# Altium footprint library smd-ipc.PCBLIB: 363 footprints (part 20 of 27)
Each footprint in its own frame and in the unit in brackets; x right, y up, seen from the top. Pads: shape width x height; smd on the part's side, far side on the other; paste and mask are expansions set on the pad; w line width, h text height; cw(c..) or ccw(c..) is an arc to the next point about the centre after c.
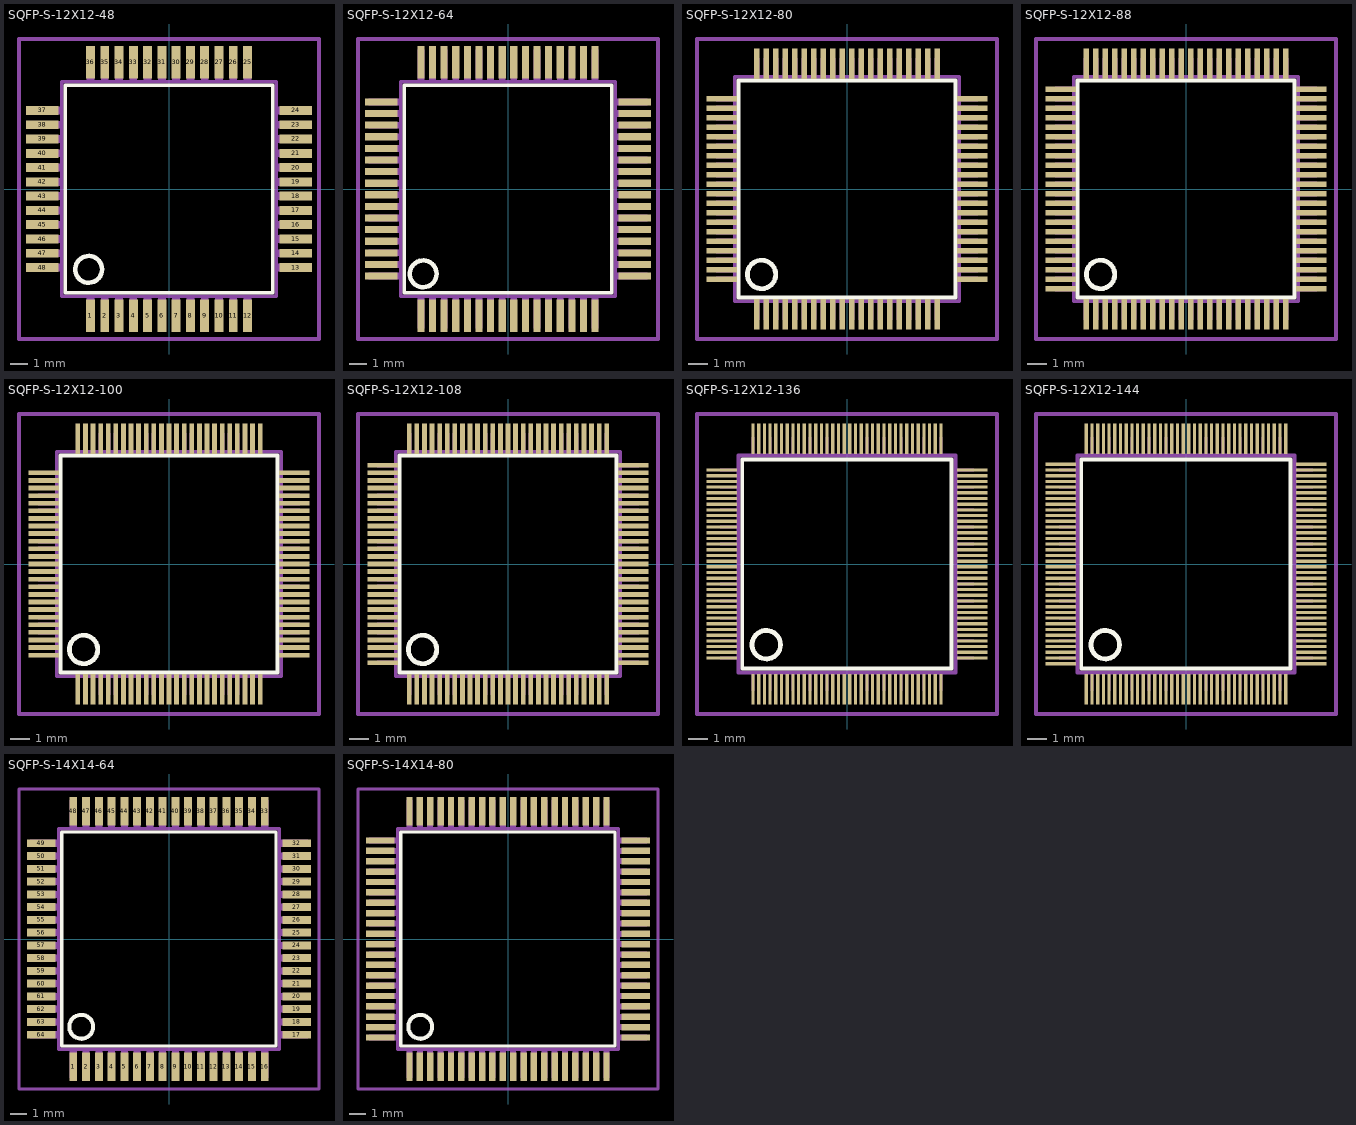
[diagram p19: the footprints below, top view; thin cyan lines are the x and y axes]

## SQFP-S-12X12-48 [mm]
pads (48):
  rect 0.5x1.8 smd: 1(-4.4,-7.1) 2(-3.6,-7.1) 3(-2.8,-7.1) 4(-2,-7.1) 5(-1.2,-7.1) 6(-0.4,-7.1) 7(0.4,-7.1) 8(1.2,-7.1) 9(2,-7.1) 10(2.8,-7.1) 11(3.6,-7.1) 12(4.4,-7.1) 25(4.4,7.1) 26(3.6,7.1) 27(2.8,7.1) 28(2,7.1) 29(1.2,7.1) 30(0.4,7.1) 31(-0.4,7.1) 32(-1.2,7.1) 33(-2,7.1) 34(-2.8,7.1) 35(-3.6,7.1) 36(-4.4,7.1)
  rect 1.8x0.5 smd: 13(7.1,-4.4) 14(7.1,-3.6) 15(7.1,-2.8) 16(7.1,-2) 17(7.1,-1.2) 18(7.1,-0.4) 19(7.1,0.4) 20(7.1,1.2) 21(7.1,2) 22(7.1,2.8) 23(7.1,3.6) 24(7.1,4.4) 37(-7.1,4.4) 38(-7.1,3.6) 39(-7.1,2.8) 40(-7.1,2) 41(-7.1,1.2) 42(-7.1,0.4) 43(-7.1,-0.4) 44(-7.1,-1.2) 45(-7.1,-2) 46(-7.1,-2.8) 47(-7.1,-3.6) 48(-7.1,-4.4)
Top Overlay:
  circle w0.254: c-4.5,-4.5 r0.75
  lines w0.203: -5.82,-5.81 5.81,-5.81 5.81,5.81 -5.82,5.81 -5.82,-5.81
Mechanical 16:
  rectangle: -4.62,-7.82 -4.18,-6.05
  rectangle: -3.82,-7.82 -3.38,-6.05
  rectangle: -3.02,-7.82 -2.58,-6.05
  rectangle: -2.22,-7.82 -1.78,-6.05
  rectangle: -1.42,-7.82 -0.98,-6.05
  rectangle: -0.62,-7.82 -0.18,-6.05
  rectangle: 0.18,-7.82 0.62,-6.05
  rectangle: 0.98,-7.82 1.42,-6.05
  rectangle: 1.78,-7.82 2.22,-6.05
  rectangle: 2.58,-7.82 3.02,-6.05
  rectangle: 3.38,-7.82 3.82,-6.05
  rectangle: 4.18,-7.82 4.62,-6.05
  rectangle: 6.05,-4.62 7.82,-4.18
  rectangle: 6.05,-3.82 7.82,-3.38
  rectangle: 6.05,-3.02 7.82,-2.58
  rectangle: 6.05,-2.22 7.82,-1.78
  rectangle: 6.05,-1.42 7.82,-0.98
  rectangle: 6.05,-0.62 7.82,-0.18
  rectangle: 6.05,0.18 7.82,0.62
  rectangle: 6.05,0.98 7.82,1.42
  rectangle: 6.05,1.78 7.82,2.22
  rectangle: 6.05,2.58 7.82,3.02
  rectangle: 6.05,3.38 7.82,3.82
  rectangle: 6.05,4.18 7.82,4.62
  rectangle: 4.18,6.05 4.62,7.82
  rectangle: 3.38,6.05 3.82,7.82
  rectangle: 2.58,6.05 3.02,7.82
  rectangle: 1.78,6.05 2.22,7.82
  rectangle: 0.98,6.05 1.42,7.82
  rectangle: 0.18,6.05 0.62,7.82
  rectangle: -0.62,6.05 -0.18,7.82
  rectangle: -1.42,6.05 -0.98,7.82
  rectangle: -2.22,6.05 -1.78,7.82
  rectangle: -3.02,6.05 -2.58,7.82
  rectangle: -3.82,6.05 -3.38,7.82
  rectangle: -4.62,6.05 -4.18,7.82
  rectangle: -7.82,4.18 -6.05,4.62
  rectangle: -7.82,3.38 -6.05,3.82
  rectangle: -7.82,2.58 -6.05,3.02
  rectangle: -7.82,1.78 -6.05,2.22
  rectangle: -7.82,0.98 -6.05,1.42
  rectangle: -7.82,0.18 -6.05,0.62
  rectangle: -7.82,-0.62 -6.05,-0.18
  rectangle: -7.82,-1.42 -6.05,-0.98
  rectangle: -7.82,-2.22 -6.05,-1.78
  rectangle: -7.82,-3.02 -6.05,-2.58
  rectangle: -7.82,-3.82 -6.05,-3.38
  rectangle: -7.82,-4.62 -6.05,-4.18
  lines w0.203: -6.01,-6.01 6.01,-6.01 6.01,6.01 -6.01,6.01 -6.01,-6.01
Mechanical 27:
  lines w0.2: -8.4,-8.4 -8.4,8.4 8.4,8.4 8.4,-8.4 -8.4,-8.4

## SQFP-S-12X12-64 [mm]
pads (64):
  rect 0.4x1.8 smd: 1(-4.875,-7.1) 2(-4.225,-7.1) 3(-3.575,-7.1) 4(-2.925,-7.1) 5(-2.275,-7.1) 6(-1.625,-7.1) 7(-0.975,-7.1) 8(-0.325,-7.1) 9(0.325,-7.1) 10(0.975,-7.1) 11(1.625,-7.1) 12(2.275,-7.1) 13(2.925,-7.1) 14(3.575,-7.1) 15(4.225,-7.1) 16(4.875,-7.1) 33(4.875,7.1) 34(4.225,7.1) 35(3.575,7.1) 36(2.925,7.1) 37(2.275,7.1) 38(1.625,7.1) 39(0.975,7.1) 40(0.325,7.1) 41(-0.325,7.1) 42(-0.975,7.1) 43(-1.625,7.1) 44(-2.275,7.1) 45(-2.925,7.1) 46(-3.575,7.1) 47(-4.225,7.1) 48(-4.875,7.1)
  rect 1.8x0.4 smd: 17(7.1,-4.875) 18(7.1,-4.225) 19(7.1,-3.575) 20(7.1,-2.925) 21(7.1,-2.275) 22(7.1,-1.625) 23(7.1,-0.975) 24(7.1,-0.325) 25(7.1,0.325) 26(7.1,0.975) 27(7.1,1.625) 28(7.1,2.275) 29(7.1,2.925) 30(7.1,3.575) 31(7.1,4.225) 32(7.1,4.875) 49(-7.1,4.875) 50(-7.1,4.225) 51(-7.1,3.575) 52(-7.1,2.925) 53(-7.1,2.275) 54(-7.1,1.625) 55(-7.1,0.975) 56(-7.1,0.325) 57(-7.1,-0.325) 58(-7.1,-0.975) 59(-7.1,-1.625) 60(-7.1,-2.275) 61(-7.1,-2.925) 62(-7.1,-3.575) 63(-7.1,-4.225) 64(-7.1,-4.875)
Top Overlay:
  circle w0.254: c-4.75,-4.75 r0.75
  lines w0.203: -5.82,-5.81 5.81,-5.81 5.81,5.81 -5.82,5.81 -5.82,-5.81
Mechanical 16:
  rectangle: -5.065,-7.82 -4.685,-6.05
  rectangle: -4.415,-7.82 -4.035,-6.05
  rectangle: -3.765,-7.82 -3.385,-6.05
  rectangle: -3.115,-7.82 -2.735,-6.05
  rectangle: -2.465,-7.82 -2.085,-6.05
  rectangle: -1.815,-7.82 -1.435,-6.05
  rectangle: -1.165,-7.82 -0.785,-6.05
  rectangle: -0.515,-7.82 -0.135,-6.05
  rectangle: 0.135,-7.82 0.515,-6.05
  rectangle: 0.785,-7.82 1.165,-6.05
  rectangle: 1.435,-7.82 1.815,-6.05
  rectangle: 2.085,-7.82 2.465,-6.05
  rectangle: 2.735,-7.82 3.115,-6.05
  rectangle: 3.385,-7.82 3.765,-6.05
  rectangle: 4.035,-7.82 4.415,-6.05
  rectangle: 4.685,-7.82 5.065,-6.05
  rectangle: 6.05,-5.065 7.82,-4.685
  rectangle: 6.05,-4.415 7.82,-4.035
  rectangle: 6.05,-3.765 7.82,-3.385
  rectangle: 6.05,-3.115 7.82,-2.735
  rectangle: 6.05,-2.465 7.82,-2.085
  rectangle: 6.05,-1.815 7.82,-1.435
  rectangle: 6.05,-1.165 7.82,-0.785
  rectangle: 6.05,-0.515 7.82,-0.135
  rectangle: 6.05,0.135 7.82,0.515
  rectangle: 6.05,0.785 7.82,1.165
  rectangle: 6.05,1.435 7.82,1.815
  rectangle: 6.05,2.085 7.82,2.465
  rectangle: 6.05,2.735 7.82,3.115
  rectangle: 6.05,3.385 7.82,3.765
  rectangle: 6.05,4.035 7.82,4.415
  rectangle: 6.05,4.685 7.82,5.065
  rectangle: 4.685,6.05 5.065,7.82
  rectangle: 4.035,6.05 4.415,7.82
  rectangle: 3.385,6.05 3.765,7.82
  rectangle: 2.735,6.05 3.115,7.82
  rectangle: 2.085,6.05 2.465,7.82
  rectangle: 1.435,6.05 1.815,7.82
  rectangle: 0.785,6.05 1.165,7.82
  rectangle: 0.135,6.05 0.515,7.82
  rectangle: -0.515,6.05 -0.135,7.82
  rectangle: -1.165,6.05 -0.785,7.82
  rectangle: -1.815,6.05 -1.435,7.82
  rectangle: -2.465,6.05 -2.085,7.82
  rectangle: -3.115,6.05 -2.735,7.82
  rectangle: -3.765,6.05 -3.385,7.82
  rectangle: -4.415,6.05 -4.035,7.82
  rectangle: -5.065,6.05 -4.685,7.82
  rectangle: -7.82,4.685 -6.05,5.065
  rectangle: -7.82,4.035 -6.05,4.415
  rectangle: -7.82,3.385 -6.05,3.765
  rectangle: -7.82,2.735 -6.05,3.115
  rectangle: -7.82,2.085 -6.05,2.465
  rectangle: -7.82,1.435 -6.05,1.815
  rectangle: -7.82,0.785 -6.05,1.165
  rectangle: -7.82,0.135 -6.05,0.515
  rectangle: -7.82,-0.515 -6.05,-0.135
  rectangle: -7.82,-1.165 -6.05,-0.785
  rectangle: -7.82,-1.815 -6.05,-1.435
  rectangle: -7.82,-2.465 -6.05,-2.085
  rectangle: -7.82,-3.115 -6.05,-2.735
  rectangle: -7.82,-3.765 -6.05,-3.385
  rectangle: -7.82,-4.415 -6.05,-4.035
  rectangle: -7.82,-5.065 -6.05,-4.685
  lines w0.203: -6.01,-6.01 6.01,-6.01 6.01,6.01 -6.01,6.01 -6.01,-6.01
Mechanical 27:
  lines w0.2: -8.4,-8.4 -8.4,8.4 8.4,8.4 8.4,-8.4 -8.4,-8.4

## SQFP-S-12X12-80 [mm]
pads (80):
  rect 0.3x1.6 smd: 1(-4.75,-6.6) 2(-4.25,-6.6) 3(-3.75,-6.6) 4(-3.25,-6.6) 5(-2.75,-6.6) 6(-2.25,-6.6) 7(-1.75,-6.6) 8(-1.25,-6.6) 9(-0.75,-6.6) 10(-0.25,-6.6) 11(0.25,-6.6) 12(0.75,-6.6) 13(1.25,-6.6) 14(1.75,-6.6) 15(2.25,-6.6) 16(2.75,-6.6) 17(3.25,-6.6) 18(3.75,-6.6) 19(4.25,-6.6) 20(4.75,-6.6) 41(4.75,6.6) 42(4.25,6.6) 43(3.75,6.6) 44(3.25,6.6) 45(2.75,6.6) 46(2.25,6.6) 47(1.75,6.6) 48(1.25,6.6) 49(0.75,6.6) 50(0.25,6.6) 51(-0.25,6.6) 52(-0.75,6.6) 53(-1.25,6.6) 54(-1.75,6.6) 55(-2.25,6.6) 56(-2.75,6.6) 57(-3.25,6.6) 58(-3.75,6.6) 59(-4.25,6.6) 60(-4.75,6.6)
  rect 1.6x0.3 smd: 21(6.6,-4.75) 22(6.6,-4.25) 23(6.6,-3.75) 24(6.6,-3.25) 25(6.6,-2.75) 26(6.6,-2.25) 27(6.6,-1.75) 28(6.6,-1.25) 29(6.6,-0.75) 30(6.6,-0.25) 31(6.6,0.25) 32(6.6,0.75) 33(6.6,1.25) 34(6.6,1.75) 35(6.6,2.25) 36(6.6,2.75) 37(6.6,3.25) 38(6.6,3.75) 39(6.6,4.25) 40(6.6,4.75) 61(-6.6,4.75) 62(-6.6,4.25) 63(-6.6,3.75) 64(-6.6,3.25) 65(-6.6,2.75) 66(-6.6,2.25) 67(-6.6,1.75) 68(-6.6,1.25) 69(-6.6,0.75) 70(-6.6,0.25) 71(-6.6,-0.25) 72(-6.6,-0.75) 73(-6.6,-1.25) 74(-6.6,-1.75) 75(-6.6,-2.25) 76(-6.6,-2.75) 77(-6.6,-3.25) 78(-6.6,-3.75) 79(-6.6,-4.25) 80(-6.6,-4.75)
Top Overlay:
  circle w0.254: c-4.5,-4.5 r0.75
  lines w0.203: -5.72,-5.71 5.71,-5.71 5.71,5.71 -5.72,5.71 -5.72,-5.71
Mechanical 16:
  rectangle: -4.9,-6.9 -4.6,-5.95
  rectangle: -4.4,-6.9 -4.1,-5.95
  rectangle: -3.9,-6.9 -3.6,-5.95
  rectangle: -3.4,-6.9 -3.1,-5.95
  rectangle: -2.9,-6.9 -2.6,-5.95
  rectangle: -2.4,-6.9 -2.1,-5.95
  rectangle: -1.9,-6.9 -1.6,-5.95
  rectangle: -1.4,-6.9 -1.1,-5.95
  rectangle: -0.9,-6.9 -0.6,-5.95
  rectangle: -0.4,-6.9 -0.1,-5.95
  rectangle: 0.1,-6.9 0.4,-5.95
  rectangle: 0.6,-6.9 0.9,-5.95
  rectangle: 1.1,-6.9 1.4,-5.95
  rectangle: 1.6,-6.9 1.9,-5.95
  rectangle: 2.1,-6.9 2.4,-5.95
  rectangle: 2.6,-6.9 2.9,-5.95
  rectangle: 3.1,-6.9 3.4,-5.95
  rectangle: 3.6,-6.9 3.9,-5.95
  rectangle: 4.1,-6.9 4.4,-5.95
  rectangle: 4.6,-6.9 4.9,-5.95
  rectangle: 5.95,-4.9 6.9,-4.6
  rectangle: 5.95,-4.4 6.9,-4.1
  rectangle: 5.95,-3.9 6.9,-3.6
  rectangle: 5.95,-3.4 6.9,-3.1
  rectangle: 5.95,-2.9 6.9,-2.6
  rectangle: 5.95,-2.4 6.9,-2.1
  rectangle: 5.95,-1.9 6.9,-1.6
  rectangle: 5.95,-1.4 6.9,-1.1
  rectangle: 5.95,-0.9 6.9,-0.6
  rectangle: 5.95,-0.4 6.9,-0.1
  rectangle: 5.95,0.1 6.9,0.4
  rectangle: 5.95,0.6 6.9,0.9
  rectangle: 5.95,1.1 6.9,1.4
  rectangle: 5.95,1.6 6.9,1.9
  rectangle: 5.95,2.1 6.9,2.4
  rectangle: 5.95,2.6 6.9,2.9
  rectangle: 5.95,3.1 6.9,3.4
  rectangle: 5.95,3.6 6.9,3.9
  rectangle: 5.95,4.1 6.9,4.4
  rectangle: 5.95,4.6 6.9,4.9
  rectangle: 4.6,5.95 4.9,6.9
  rectangle: 4.1,5.95 4.4,6.9
  rectangle: 3.6,5.95 3.9,6.9
  rectangle: 3.1,5.95 3.4,6.9
  rectangle: 2.6,5.95 2.9,6.9
  rectangle: 2.1,5.95 2.4,6.9
  rectangle: 1.6,5.95 1.9,6.9
  rectangle: 1.1,5.95 1.4,6.9
  rectangle: 0.6,5.95 0.9,6.9
  rectangle: 0.1,5.95 0.4,6.9
  rectangle: -0.4,5.95 -0.1,6.9
  rectangle: -0.9,5.95 -0.6,6.9
  rectangle: -1.4,5.95 -1.1,6.9
  rectangle: -1.9,5.95 -1.6,6.9
  rectangle: -2.4,5.95 -2.1,6.9
  rectangle: -2.9,5.95 -2.6,6.9
  rectangle: -3.4,5.95 -3.1,6.9
  rectangle: -3.9,5.95 -3.6,6.9
  rectangle: -4.4,5.95 -4.1,6.9
  rectangle: -4.9,5.95 -4.6,6.9
  rectangle: -6.9,4.6 -5.95,4.9
  rectangle: -6.9,4.1 -5.95,4.4
  rectangle: -6.9,3.6 -5.95,3.9
  rectangle: -6.9,3.1 -5.95,3.4
  rectangle: -6.9,2.6 -5.95,2.9
  rectangle: -6.9,2.1 -5.95,2.4
  rectangle: -6.9,1.6 -5.95,1.9
  rectangle: -6.9,1.1 -5.95,1.4
  rectangle: -6.9,0.6 -5.95,0.9
  rectangle: -6.9,0.1 -5.95,0.4
  rectangle: -6.9,-0.4 -5.95,-0.1
  rectangle: -6.9,-0.9 -5.95,-0.6
  rectangle: -6.9,-1.4 -5.95,-1.1
  rectangle: -6.9,-1.9 -5.95,-1.6
  rectangle: -6.9,-2.4 -5.95,-2.1
  rectangle: -6.9,-2.9 -5.95,-2.6
  rectangle: -6.9,-3.4 -5.95,-3.1
  rectangle: -6.9,-3.9 -5.95,-3.6
  rectangle: -6.9,-4.4 -5.95,-4.1
  rectangle: -6.9,-4.9 -5.95,-4.6
  lines w0.203: -5.91,-5.91 5.91,-5.91 5.91,5.91 -5.91,5.91 -5.91,-5.91
Mechanical 27:
  lines w0.2: -7.9,-7.9 -7.9,7.9 7.9,7.9 7.9,-7.9 -7.9,-7.9

## SQFP-S-12X12-88 [mm]
pads (88):
  rect 0.3x1.6 smd: 1(-5.25,-6.6) 2(-4.75,-6.6) 3(-4.25,-6.6) 4(-3.75,-6.6) 5(-3.25,-6.6) 6(-2.75,-6.6) 7(-2.25,-6.6) 8(-1.75,-6.6) 9(-1.25,-6.6) 10(-0.75,-6.6) 11(-0.25,-6.6) 12(0.25,-6.6) 13(0.75,-6.6) 14(1.25,-6.6) 15(1.75,-6.6) 16(2.25,-6.6) 17(2.75,-6.6) 18(3.25,-6.6) 19(3.75,-6.6) 20(4.25,-6.6) 21(4.75,-6.6) 22(5.25,-6.6) 45(5.25,6.6) 46(4.75,6.6) 47(4.25,6.6) 48(3.75,6.6) 49(3.25,6.6) 50(2.75,6.6) 51(2.25,6.6) 52(1.75,6.6) 53(1.25,6.6) 54(0.75,6.6) 55(0.25,6.6) 56(-0.25,6.6) 57(-0.75,6.6) 58(-1.25,6.6) 59(-1.75,6.6) 60(-2.25,6.6) 61(-2.75,6.6) 62(-3.25,6.6) 63(-3.75,6.6) 64(-4.25,6.6) 65(-4.75,6.6) 66(-5.25,6.6)
  rect 1.6x0.3 smd: 23(6.6,-5.25) 24(6.6,-4.75) 25(6.6,-4.25) 26(6.6,-3.75) 27(6.6,-3.25) 28(6.6,-2.75) 29(6.6,-2.25) 30(6.6,-1.75) 31(6.6,-1.25) 32(6.6,-0.75) 33(6.6,-0.25) 34(6.6,0.25) 35(6.6,0.75) 36(6.6,1.25) 37(6.6,1.75) 38(6.6,2.25) 39(6.6,2.75) 40(6.6,3.25) 41(6.6,3.75) 42(6.6,4.25) 43(6.6,4.75) 44(6.6,5.25) 67(-6.6,5.25) 68(-6.6,4.75) 69(-6.6,4.25) 70(-6.6,3.75) 71(-6.6,3.25) 72(-6.6,2.75) 73(-6.6,2.25) 74(-6.6,1.75) 75(-6.6,1.25) 76(-6.6,0.75) 77(-6.6,0.25) 78(-6.6,-0.25) 79(-6.6,-0.75) 80(-6.6,-1.25) 81(-6.6,-1.75) 82(-6.6,-2.25) 83(-6.6,-2.75) 84(-6.6,-3.25) 85(-6.6,-3.75) 86(-6.6,-4.25) 87(-6.6,-4.75) 88(-6.6,-5.25)
Top Overlay:
  circle w0.254: c-4.5,-4.5 r0.75
  lines w0.203: -5.72,-5.71 5.71,-5.71 5.71,5.71 -5.72,5.71 -5.72,-5.71
Mechanical 16:
  rectangle: -5.4,-6.9 -5.1,-5.95
  rectangle: -4.9,-6.9 -4.6,-5.95
  rectangle: -4.4,-6.9 -4.1,-5.95
  rectangle: -3.9,-6.9 -3.6,-5.95
  rectangle: -3.4,-6.9 -3.1,-5.95
  rectangle: -2.9,-6.9 -2.6,-5.95
  rectangle: -2.4,-6.9 -2.1,-5.95
  rectangle: -1.9,-6.9 -1.6,-5.95
  rectangle: -1.4,-6.9 -1.1,-5.95
  rectangle: -0.9,-6.9 -0.6,-5.95
  rectangle: -0.4,-6.9 -0.1,-5.95
  rectangle: 0.1,-6.9 0.4,-5.95
  rectangle: 0.6,-6.9 0.9,-5.95
  rectangle: 1.1,-6.9 1.4,-5.95
  rectangle: 1.6,-6.9 1.9,-5.95
  rectangle: 2.1,-6.9 2.4,-5.95
  rectangle: 2.6,-6.9 2.9,-5.95
  rectangle: 3.1,-6.9 3.4,-5.95
  rectangle: 3.6,-6.9 3.9,-5.95
  rectangle: 4.1,-6.9 4.4,-5.95
  rectangle: 4.6,-6.9 4.9,-5.95
  rectangle: 5.1,-6.9 5.4,-5.95
  rectangle: 5.95,-5.4 6.9,-5.1
  rectangle: 5.95,-4.9 6.9,-4.6
  rectangle: 5.95,-4.4 6.9,-4.1
  rectangle: 5.95,-3.9 6.9,-3.6
  rectangle: 5.95,-3.4 6.9,-3.1
  rectangle: 5.95,-2.9 6.9,-2.6
  rectangle: 5.95,-2.4 6.9,-2.1
  rectangle: 5.95,-1.9 6.9,-1.6
  rectangle: 5.95,-1.4 6.9,-1.1
  rectangle: 5.95,-0.9 6.9,-0.6
  rectangle: 5.95,-0.4 6.9,-0.1
  rectangle: 5.95,0.1 6.9,0.4
  rectangle: 5.95,0.6 6.9,0.9
  rectangle: 5.95,1.1 6.9,1.4
  rectangle: 5.95,1.6 6.9,1.9
  rectangle: 5.95,2.1 6.9,2.4
  rectangle: 5.95,2.6 6.9,2.9
  rectangle: 5.95,3.1 6.9,3.4
  rectangle: 5.95,3.6 6.9,3.9
  rectangle: 5.95,4.1 6.9,4.4
  rectangle: 5.95,4.6 6.9,4.9
  rectangle: 5.95,5.1 6.9,5.4
  rectangle: 5.1,5.95 5.4,6.9
  rectangle: 4.6,5.95 4.9,6.9
  rectangle: 4.1,5.95 4.4,6.9
  rectangle: 3.6,5.95 3.9,6.9
  rectangle: 3.1,5.95 3.4,6.9
  rectangle: 2.6,5.95 2.9,6.9
  rectangle: 2.1,5.95 2.4,6.9
  rectangle: 1.6,5.95 1.9,6.9
  rectangle: 1.1,5.95 1.4,6.9
  rectangle: 0.6,5.95 0.9,6.9
  rectangle: 0.1,5.95 0.4,6.9
  rectangle: -0.4,5.95 -0.1,6.9
  rectangle: -0.9,5.95 -0.6,6.9
  rectangle: -1.4,5.95 -1.1,6.9
  rectangle: -1.9,5.95 -1.6,6.9
  rectangle: -2.4,5.95 -2.1,6.9
  rectangle: -2.9,5.95 -2.6,6.9
  rectangle: -3.4,5.95 -3.1,6.9
  rectangle: -3.9,5.95 -3.6,6.9
  rectangle: -4.4,5.95 -4.1,6.9
  rectangle: -4.9,5.95 -4.6,6.9
  rectangle: -5.4,5.95 -5.1,6.9
  rectangle: -6.9,5.1 -5.95,5.4
  rectangle: -6.9,4.6 -5.95,4.9
  rectangle: -6.9,4.1 -5.95,4.4
  rectangle: -6.9,3.6 -5.95,3.9
  rectangle: -6.9,3.1 -5.95,3.4
  rectangle: -6.9,2.6 -5.95,2.9
  rectangle: -6.9,2.1 -5.95,2.4
  rectangle: -6.9,1.6 -5.95,1.9
  rectangle: -6.9,1.1 -5.95,1.4
  rectangle: -6.9,0.6 -5.95,0.9
  rectangle: -6.9,0.1 -5.95,0.4
  rectangle: -6.9,-0.4 -5.95,-0.1
  rectangle: -6.9,-0.9 -5.95,-0.6
  rectangle: -6.9,-1.4 -5.95,-1.1
  rectangle: -6.9,-1.9 -5.95,-1.6
  rectangle: -6.9,-2.4 -5.95,-2.1
  rectangle: -6.9,-2.9 -5.95,-2.6
  rectangle: -6.9,-3.4 -5.95,-3.1
  rectangle: -6.9,-3.9 -5.95,-3.6
  rectangle: -6.9,-4.4 -5.95,-4.1
  rectangle: -6.9,-4.9 -5.95,-4.6
  rectangle: -6.9,-5.4 -5.95,-5.1
  lines w0.203: -5.91,-5.91 5.91,-5.91 5.91,5.91 -5.91,5.91 -5.91,-5.91
Mechanical 27:
  lines w0.2: -7.9,-7.9 -7.9,7.9 7.9,7.9 7.9,-7.9 -7.9,-7.9

## SQFP-S-12X12-100 [mm]
pads (100):
  rect 0.25x1.6 smd: 1(-4.8,-6.6) 2(-4.4,-6.6) 3(-4,-6.6) 4(-3.6,-6.6) 5(-3.2,-6.6) 6(-2.8,-6.6) 7(-2.4,-6.6) 8(-2,-6.6) 9(-1.6,-6.6) 10(-1.2,-6.6) 11(-0.8,-6.6) 12(-0.4,-6.6) 13(0,-6.6) 14(0.4,-6.6) 15(0.8,-6.6) 16(1.2,-6.6) 17(1.6,-6.6) 18(2,-6.6) 19(2.4,-6.6) 20(2.8,-6.6) 21(3.2,-6.6) 22(3.6,-6.6) 23(4,-6.6) 24(4.4,-6.6) 25(4.8,-6.6) 51(4.8,6.6) 52(4.4,6.6) 53(4,6.6) 54(3.6,6.6) 55(3.2,6.6) 56(2.8,6.6) 57(2.4,6.6) 58(2,6.6) 59(1.6,6.6) 60(1.2,6.6) 61(0.8,6.6) 62(0.4,6.6) 63(0,6.6) 64(-0.4,6.6) 65(-0.8,6.6) 66(-1.2,6.6) 67(-1.6,6.6) 68(-2,6.6) 69(-2.4,6.6) 70(-2.8,6.6) 71(-3.2,6.6) 72(-3.6,6.6) 73(-4,6.6) 74(-4.4,6.6) 75(-4.8,6.6)
  rect 1.6x0.25 smd: 26(6.6,-4.8) 27(6.6,-4.4) 28(6.6,-4) 29(6.6,-3.6) 30(6.6,-3.2) 31(6.6,-2.8) 32(6.6,-2.4) 33(6.6,-2) 34(6.6,-1.6) 35(6.6,-1.2) 36(6.6,-0.8) 37(6.6,-0.4) 38(6.6,0) 39(6.6,0.4) 40(6.6,0.8) 41(6.6,1.2) 42(6.6,1.6) 43(6.6,2) 44(6.6,2.4) 45(6.6,2.8) 46(6.6,3.2) 47(6.6,3.6) 48(6.6,4) 49(6.6,4.4) 50(6.6,4.8) 76(-6.6,4.8) 77(-6.6,4.4) 78(-6.6,4) 79(-6.6,3.6) 80(-6.6,3.2) 81(-6.6,2.8) 82(-6.6,2.4) 83(-6.6,2) 84(-6.6,1.6) 85(-6.6,1.2) 86(-6.6,0.8) 87(-6.6,0.4) 88(-6.6,0) 89(-6.6,-0.4) 90(-6.6,-0.8) 91(-6.6,-1.2) 92(-6.6,-1.6) 93(-6.6,-2) 94(-6.6,-2.4) 95(-6.6,-2.8) 96(-6.6,-3.2) 97(-6.6,-3.6) 98(-6.6,-4) 99(-6.6,-4.4) 100(-6.6,-4.8)
Top Overlay:
  circle w0.254: c-4.5,-4.5 r0.75
  lines w0.203: -5.72,-5.71 5.71,-5.71 5.71,5.71 -5.72,5.71 -5.72,-5.71
Mechanical 16:
  rectangle: -4.91,-6.9 -4.69,-5.95
  rectangle: -4.51,-6.9 -4.29,-5.95
  rectangle: -4.11,-6.9 -3.89,-5.95
  rectangle: -3.71,-6.9 -3.49,-5.95
  rectangle: -3.31,-6.9 -3.09,-5.95
  rectangle: -2.91,-6.9 -2.69,-5.95
  rectangle: -2.51,-6.9 -2.29,-5.95
  rectangle: -2.11,-6.9 -1.89,-5.95
  rectangle: -1.71,-6.9 -1.49,-5.95
  rectangle: -1.31,-6.9 -1.09,-5.95
  rectangle: -0.91,-6.9 -0.69,-5.95
  rectangle: -0.51,-6.9 -0.29,-5.95
  rectangle: -0.11,-6.9 0.11,-5.95
  rectangle: 0.29,-6.9 0.51,-5.95
  rectangle: 0.69,-6.9 0.91,-5.95
  rectangle: 1.09,-6.9 1.31,-5.95
  rectangle: 1.49,-6.9 1.71,-5.95
  rectangle: 1.89,-6.9 2.11,-5.95
  rectangle: 2.29,-6.9 2.51,-5.95
  rectangle: 2.69,-6.9 2.91,-5.95
  rectangle: 3.09,-6.9 3.31,-5.95
  rectangle: 3.49,-6.9 3.71,-5.95
  rectangle: 3.89,-6.9 4.11,-5.95
  rectangle: 4.29,-6.9 4.51,-5.95
  rectangle: 4.69,-6.9 4.91,-5.95
  rectangle: 5.95,-4.91 6.9,-4.69
  rectangle: 5.95,-4.51 6.9,-4.29
  rectangle: 5.95,-4.11 6.9,-3.89
  rectangle: 5.95,-3.71 6.9,-3.49
  rectangle: 5.95,-3.31 6.9,-3.09
  rectangle: 5.95,-2.91 6.9,-2.69
  rectangle: 5.95,-2.51 6.9,-2.29
  rectangle: 5.95,-2.11 6.9,-1.89
  rectangle: 5.95,-1.71 6.9,-1.49
  rectangle: 5.95,-1.31 6.9,-1.09
  rectangle: 5.95,-0.91 6.9,-0.69
  rectangle: 5.95,-0.51 6.9,-0.29
  rectangle: 5.95,-0.11 6.9,0.11
  rectangle: 5.95,0.29 6.9,0.51
  rectangle: 5.95,0.69 6.9,0.91
  rectangle: 5.95,1.09 6.9,1.31
  rectangle: 5.95,1.49 6.9,1.71
  rectangle: 5.95,1.89 6.9,2.11
  rectangle: 5.95,2.29 6.9,2.51
  rectangle: 5.95,2.69 6.9,2.91
  rectangle: 5.95,3.09 6.9,3.31
  rectangle: 5.95,3.49 6.9,3.71
  rectangle: 5.95,3.89 6.9,4.11
  rectangle: 5.95,4.29 6.9,4.51
  rectangle: 5.95,4.69 6.9,4.91
  rectangle: 4.69,5.95 4.91,6.9
  rectangle: 4.29,5.95 4.51,6.9
  rectangle: 3.89,5.95 4.11,6.9
  rectangle: 3.49,5.95 3.71,6.9
  rectangle: 3.09,5.95 3.31,6.9
  rectangle: 2.69,5.95 2.91,6.9
  rectangle: 2.29,5.95 2.51,6.9
  rectangle: 1.89,5.95 2.11,6.9
  rectangle: 1.49,5.95 1.71,6.9
  rectangle: 1.09,5.95 1.31,6.9
  rectangle: 0.69,5.95 0.91,6.9
  rectangle: 0.29,5.95 0.51,6.9
  rectangle: -0.11,5.95 0.11,6.9
  rectangle: -0.51,5.95 -0.29,6.9
  rectangle: -0.91,5.95 -0.69,6.9
  rectangle: -1.31,5.95 -1.09,6.9
  rectangle: -1.71,5.95 -1.49,6.9
  rectangle: -2.11,5.95 -1.89,6.9
  rectangle: -2.51,5.95 -2.29,6.9
  rectangle: -2.91,5.95 -2.69,6.9
  rectangle: -3.31,5.95 -3.09,6.9
  rectangle: -3.71,5.95 -3.49,6.9
  rectangle: -4.11,5.95 -3.89,6.9
  rectangle: -4.51,5.95 -4.29,6.9
  rectangle: -4.91,5.95 -4.69,6.9
  rectangle: -6.9,4.69 -5.95,4.91
  rectangle: -6.9,4.29 -5.95,4.51
  rectangle: -6.9,3.89 -5.95,4.11
  rectangle: -6.9,3.49 -5.95,3.71
  rectangle: -6.9,3.09 -5.95,3.31
  rectangle: -6.9,2.69 -5.95,2.91
  rectangle: -6.9,2.29 -5.95,2.51
  rectangle: -6.9,1.89 -5.95,2.11
  rectangle: -6.9,1.49 -5.95,1.71
  rectangle: -6.9,1.09 -5.95,1.31
  rectangle: -6.9,0.69 -5.95,0.91
  rectangle: -6.9,0.29 -5.95,0.51
  rectangle: -6.9,-0.11 -5.95,0.11
  rectangle: -6.9,-0.51 -5.95,-0.29
  rectangle: -6.9,-0.91 -5.95,-0.69
  rectangle: -6.9,-1.31 -5.95,-1.09
  rectangle: -6.9,-1.71 -5.95,-1.49
  rectangle: -6.9,-2.11 -5.95,-1.89
  rectangle: -6.9,-2.51 -5.95,-2.29
  rectangle: -6.9,-2.91 -5.95,-2.69
  rectangle: -6.9,-3.31 -5.95,-3.09
  rectangle: -6.9,-3.71 -5.95,-3.49
  rectangle: -6.9,-4.11 -5.95,-3.89
  rectangle: -6.9,-4.51 -5.95,-4.29
  rectangle: -6.9,-4.91 -5.95,-4.69
  lines w0.203: -5.91,-5.91 5.91,-5.91 5.91,5.91 -5.91,5.91 -5.91,-5.91
Mechanical 27:
  lines w0.2: -7.9,-7.9 -7.9,7.9 7.9,7.9 7.9,-7.9 -7.9,-7.9
